# Altium footprint library HARTING THD.PcbLib: 113 footprints (part 3 of 11) (continued)
## HARTING_09 03 296 6850 [mm] "DIN 41612, Type C,  Thru-Hole Press-in Terminations; Rows a+b+c, 96 Position, Performance level 2, Lead 4.5mm, Pitch 2.54mm, Straight Female Connector" (continued)
  text "15" at -5.475,-36.135 h1.2
  text "1" at -4.075,-0.675 h1.2
Mechanical 8:
  lines w0.1: 1.54,-39.37 2.54,-39.37 ; 2.24,-84.37 4.78,-84.37 ; 2.24,5.63 4.78,5.63 ; 2.54,-40.37 2.54,-39.37 ; 2.54,-38.37 2.54,-39.37 ; 3.54,-39.37 2.54,-39.37
Mechanical 14:
  circle w0.1: c2.24,5.63 r1.425
  circle w0.1: c2.24,-84.37 r1.425
  lines w0.1: -2.71,-84.37 -0.735,-84.37 ; -2.71,5.63 -0.735,5.63 ; -0.735,-86.77 -0.735,-84.37 ; -0.735,8.03 -0.735,5.63 ; 3.665,-80.145 3.665,-81.845 ; 3.665,1.405 3.665,3.105 3.015,2.455 ; 3.757,3.105 5.215,5.63 ; 5.215,-86.77 5.215,-84.37 ; 5.215,8.03 5.215,5.63 ; 7.79,-84.37 5.215,-84.37 ; 7.79,5.63 5.215,5.63 ; -1.685,-81.845 -1.685,3.105 ; -1.685,-81.845 0,-81.845 0,-81.195 ; -1.685,-81.845 -1.035,-81.195 ; -1.685,3.105 0,3.105 0,2.455 ; -1.685,3.105 -1.035,2.455 ; -1.035,-81.195 0,-81.195 ; -1.035,-81.195 -1.035,2.455 ; -1.035,2.455 0,2.455 ; -0.735,-84.37 0.723,-81.845 2.54,-81.845 ; -0.735,5.63 0.723,3.105 2.54,3.105 2.54,2.455 ; 0,-81.195 0,-80.145 2.54,-80.145 2.54,-81.195 ; 0,2.455 0,1.405 2.54,1.405 2.54,2.455 ; 2.54,-81.845 3.665,-81.845 ; 2.54,-81.845 2.54,-81.195 ; 2.54,-81.195 3.015,-81.195 ; 2.54,2.455 3.015,2.455 ; 3.015,-81.195 3.665,-81.845 ; 3.015,-81.195 3.015,-80.145 5.08,-80.145 ; 3.015,2.455 3.015,1.405 5.08,1.405 ; 3.665,-81.845 3.757,-81.845 5.215,-84.37 ; 5.08,-80.145 5.08,-80.795 6.765,-80.795 ; 5.08,-80.145 6.115,-80.145 ; 5.08,1.405 5.08,2.055 6.765,2.055 ; 5.08,1.405 6.115,1.405 ; 6.115,-80.145 6.765,-80.795 ; 6.115,-80.145 6.115,1.405 ; 6.115,1.405 6.765,2.055 ; 6.765,-80.795 6.765,2.055 ; -2.71,-85.77 ccw(c-1.71,-85.77) -1.71,-86.77 6.79,-86.77 ccw(c6.79,-85.77) 7.79,-85.77 7.79,7.03 ccw(c6.79,7.03) 6.79,8.03 -1.71,8.03 ccw(c-1.71,7.03) -2.71,7.03 -2.71,-85.77
  text "a" at -1.951,3.96 h1.2
  text "c" at 5.305,2.935 h1.2
  text "10" at -5.475,-23.46 h1.2
  text "32" at -5.675,-79.365 h1.2
  text "5" at -4.55,-10.835 h1.2
  text "30" at -5.675,-74.285 h1.2
  text "25" at -5.675,-61.585 h1.2
  text "20" at -5.675,-48.885 h1.2
  text "15" at -5.475,-36.135 h1.2
  text "1" at -4.075,-0.675 h1.2
Drill Drawing:
  lines w0.1: -2.54,-58.42 -2.54,-81.28 7.62,-81.28 7.62,2.54 -2.54,2.54 -2.54,-20.32
  text "PRESS-FIT TECHNOLOGY diam. 1mm +0.1 -0" at -1.905,-56.515 h1
3D body "HARTING_09 03 296 6850.stp": height 11.6, standoff -4.5, extent -2.71,-86.82 7.79,8.08

## HARTING_09 03 296 6861 [mm] "DIN 41612, Type C, 96 Position, Rows a+b+c, Performance level 2, Press-in Lead Lead 13mm, Pitch 2.54mm, Straight Female Connector"
height 11.6
pads (98):
  round 1.5 hole 1: a1(0,0) a2(0,-2.54) a3(0,-5.08) a4(0,-7.62) a5(0,-10.16) a6(0,-12.7) a7(0,-15.24) a8(0,-17.78) a9(0,-20.32) a10(0,-22.86) a11(0,-25.4) a12(0,-27.94) a13(0,-30.48) a14(0,-33.02) a15(0,-35.56) a16(0,-38.1) a17(0,-40.64) a18(0,-43.18) a19(0,-45.72) a20(0,-48.26) a21(0,-50.8) a22(0,-53.34) a23(0,-55.88) a24(0,-58.42) a25(0,-60.96) a26(0,-63.5) a27(0,-66.04) a28(0,-68.58) a29(0,-71.12) a30(0,-73.66) a31(0,-76.2) a32(0,-78.74) b1(2.54,0) b2(2.54,-2.54) b3(2.54,-5.08) b4(2.54,-7.62) b5(2.54,-10.16) b6(2.54,-12.7) b7(2.54,-15.24) b8(2.54,-17.78) b9(2.54,-20.32) b10(2.54,-22.86) b11(2.54,-25.4) b12(2.54,-27.94) b13(2.54,-30.48) b14(2.54,-33.02) b15(2.54,-35.56) b16(2.54,-38.1) b17(2.54,-40.64) b18(2.54,-43.18) b19(2.54,-45.72) b20(2.54,-48.26) b21(2.54,-50.8) b22(2.54,-53.34) b23(2.54,-55.88) b24(2.54,-58.42) b25(2.54,-60.96) b26(2.54,-63.5) b27(2.54,-66.04) b28(2.54,-68.58) b29(2.54,-71.12) b30(2.54,-73.66) b31(2.54,-76.2) b32(2.54,-78.74) c1(5.08,0) c2(5.08,-2.54) c3(5.08,-5.08) c4(5.08,-7.62) c5(5.08,-10.16) c6(5.08,-12.7) c7(5.08,-15.24) c8(5.08,-17.78) c9(5.08,-20.32) c10(5.08,-22.86) c11(5.08,-25.4) c12(5.08,-27.94) c13(5.08,-30.48) c14(5.08,-33.02) c15(5.08,-35.56) c16(5.08,-38.1) c17(5.08,-40.64) c18(5.08,-43.18) c19(5.08,-45.72) c20(5.08,-48.26) c21(5.08,-50.8) c22(5.08,-53.34) c23(5.08,-55.88) c24(5.08,-58.42) c25(5.08,-60.96) c26(5.08,-63.5) c27(5.08,-66.04) c28(5.08,-68.58) c29(5.08,-71.12) c30(5.08,-73.66) c31(5.08,-76.2) c32(5.08,-78.74)
  round 3.5 / inner round 3.5 / far side round 5.1 hole 2.8: MTG1(2.24,5.63) MTG2(2.24,-84.37)
Top Overlay:
  lines w0.2: -1.06,-79.034 -1.06,-81.22 ; -1.06,0.294 -1.06,2.48 ; -0.76,-86.87 -0.76,-84.37 0.683,-81.87 3.797,-81.87 5.24,-84.37 5.24,-86.87 ; -0.76,8.13 -0.76,5.63 0.683,3.13 3.797,3.13 5.24,5.63 5.24,8.13 ; -0.51,-81.22 -1.06,-81.22 ; -0.51,2.48 -1.06,2.48 ; 2.49,-81.87 2.49,-80.87 -0.51,-80.87 -0.51,-81.87 -1.71,-81.87 ; 2.49,-81.22 3.04,-81.22 ; 2.49,2.48 3.04,2.48 ; 6.14,-79.034 6.14,-80.22 ; 6.14,0.294 6.14,1.48 ; -1.71,-81.87 -1.06,-81.22 ; -1.71,-81.87 -1.71,3.13 ; -1.71,3.13 -1.06,2.48 ; -1.71,3.13 -0.51,3.13 -0.51,2.13 2.49,2.13 2.49,3.13 3.69,3.13 ; 3.04,-81.22 3.69,-81.87 3.69,-80.87 ; 3.04,-81.22 3.04,-80.22 ; 3.04,-80.22 3.69,-80.87 ; 3.04,-80.22 6.14,-80.22 ; 3.04,1.48 6.14,1.48 ; 3.04,1.48 3.69,2.13 ; 3.04,1.48 3.04,2.48 ; 3.04,2.48 3.69,3.13 ; 3.69,-80.87 6.79,-80.87 ; 3.69,2.13 6.79,2.13 ; 3.69,2.13 3.69,3.13 ; 6.14,-80.22 6.79,-80.87 ; 6.14,1.48 6.79,2.13 ; 6.79,-80.87 6.79,2.13 ; -2.76,-85.87 ccw(c-1.76,-85.87) -1.76,-86.87 6.84,-86.87 ccw(c6.84,-85.87) 7.84,-85.87 7.84,7.13 ccw(c6.84,7.13) 6.84,8.13 -1.76,8.13 ccw(c-1.76,7.13) -2.76,7.13 -2.76,-85.87
  text "a" at -1.951,3.96 h1.2
  text "c" at 5.305,2.935 h1.2
  text "10" at -5.475,-23.46 h1.2
  text "32" at -5.675,-79.365 h1.2
  text "5" at -4.55,-10.835 h1.2
  text "30" at -5.675,-74.285 h1.2
  text "25" at -5.675,-61.585 h1.2
  text "20" at -5.675,-48.885 h1.2
  text "15" at -5.475,-36.135 h1.2
  text "1" at -4.075,-0.675 h1.2
Mechanical 8:
  lines w0.1: -1,-78.74 0,-78.74 ; -1,0 0,0 ; 0,-79.74 0,-78.74 ; 0,-77.74 0,-78.74 ; 0,-1 0,0 ; 0,1 0,0 ; 1,-78.74 0,-78.74 ; 1,0 0,0 ; 1.24,-84.37 2.24,-84.37 ; 1.24,5.63 2.24,5.63 ; 1.54,-78.74 2.54,-78.74 ; 1.54,-39.37 2.54,-39.37 ; 1.54,0 2.54,0 ; 2.24,-85.37 2.24,-84.37 ; 2.24,-83.37 2.24,-84.37 ; 2.24,4.63 2.24,5.63 ; 2.24,6.63 2.24,5.63 ; 2.54,-79.74 2.54,-78.74 ; 2.54,-77.74 2.54,-78.74 ; 2.54,-40.37 2.54,-39.37 ; 2.54,-38.37 2.54,-39.37 ; 2.54,-1 2.54,0 ; 2.54,1 2.54,0 ; 3.24,-84.37 2.24,-84.37 ; 3.24,5.63 2.24,5.63 ; 3.54,-78.74 2.54,-78.74 ; 3.54,-39.37 2.54,-39.37 ; 3.54,0 2.54,0 ; 4.08,-78.74 5.08,-78.74 ; 4.08,0 5.08,0 ; 4.78,-84.37 2.24,-84.37 ; 4.78,5.63 2.24,5.63 ; 5.08,-79.74 5.08,-78.74 ; 5.08,-77.74 5.08,-78.74 ; 5.08,-1 5.08,0 ; 5.08,1 5.08,0 ; 6.08,-78.74 5.08,-78.74 ; 6.08,0 5.08,0
Mechanical 14:
  circle w0.1: c2.24,5.63 r1.4
  circle w0.1: c2.24,-84.37 r1.4
  lines w0.1: -0.76,-86.87 -0.76,-84.37 0.683,-81.87 3.797,-81.87 5.24,-84.37 5.24,-86.87 ; -0.76,8.13 -0.76,5.63 0.683,3.13 3.797,3.13 5.24,5.63 5.24,8.13 ; -0.51,-81.22 -1.06,-81.22 ; -0.51,2.48 -1.06,2.48 ; 2.49,-81.87 2.49,-80.87 -0.51,-80.87 -0.51,-81.87 -1.71,-81.87 ; 2.49,-81.22 3.04,-81.22 ; 2.49,2.48 3.04,2.48 ; -1.71,-81.87 -1.06,-81.22 ; -1.71,-81.87 -1.71,3.13 ; -1.71,3.13 -1.06,2.48 ; -1.71,3.13 -0.51,3.13 -0.51,2.13 2.49,2.13 2.49,3.13 3.69,3.13 ; -1.06,-81.22 -1.06,2.48 ; 3.04,-81.22 3.04,-80.22 ; 3.04,-81.22 3.69,-81.87 3.69,-80.87 ; 3.04,-80.22 3.69,-80.87 ; 3.04,-80.22 6.14,-80.22 ; 3.04,1.48 3.69,2.13 ; 3.04,1.48 3.04,2.48 ; 3.04,1.48 6.14,1.48 ; 3.04,2.48 3.69,3.13 ; 3.69,-80.87 6.79,-80.87 ; 3.69,2.13 6.79,2.13 ; 3.69,2.13 3.69,3.13 ; 6.14,-80.22 6.79,-80.87 ; 6.14,-80.22 6.14,1.48 ; 6.14,1.48 6.79,2.13 ; 6.79,-80.87 6.79,2.13 ; -2.76,-85.87 ccw(c-1.76,-85.87) -1.76,-86.87 6.84,-86.87 ccw(c6.84,-85.87) 7.84,-85.87 7.84,7.13 ccw(c6.84,7.13) 6.84,8.13 -1.76,8.13 ccw(c-1.76,7.13) -2.76,7.13 -2.76,-85.87
  text "a" at -1.951,3.96 h1.2
  text "c" at 5.305,2.935 h1.2
  text "10" at -5.475,-23.46 h1.2
  text "32" at -5.675,-79.365 h1.2
  text "5" at -4.55,-10.835 h1.2
  text "30" at -5.675,-74.285 h1.2
  text "25" at -5.675,-61.585 h1.2
  text "20" at -5.675,-48.885 h1.2
  text "15" at -5.475,-36.135 h1.2
  text "1" at -4.075,-0.675 h1.2
Drill Drawing:
  lines w0.1: -2.54,-58.42 -2.54,-81.28 7.62,-81.28 7.62,2.54 -2.54,2.54 -2.54,-20.32
  text "PRESS-FIT TECHNOLOGY diam. 1mm +0.1 -0" at -2.005,-55.49 h1
3D body "HARTING_09 03 296 6861.stp": height 11.6, standoff -13, extent -2.76,-86.87 7.84,8.13

## HARTING_09 03 696 6921 [mm] "DIN 41612, Type C, Thru-Hole;  Rows a+b+c, 96 Position, Performance level 2, Lead 3.0 mm, Pitch 2.54mm, Right Angle Male Connector With Coding"
height 13.1
pads (98):
  round 1.7 hole 1: a1(0,0) a2(0,-2.54) a3(0,-5.08) a4(0,-7.62) a5(0,-10.16) a6(0,-12.7) a7(0,-15.24) a8(0,-17.78) a9(0,-20.32) a10(0,-22.86) a11(0,-25.4) a12(0,-27.94) a13(0,-30.48) a14(0,-33.02) a15(0,-35.56) a16(0,-38.1) a17(0,-40.64) a18(0,-43.18) a19(0,-45.72) a20(0,-48.26) a21(0,-50.8) a22(0,-53.34) a23(0,-55.88) a24(0,-58.42) a25(0,-60.96) a26(0,-63.5) a27(0,-66.04) a28(0,-68.58) a29(0,-71.12) a30(0,-73.66) a31(0,-76.2) a32(0,-78.74) b1(-2.54,0) b2(-2.54,-2.54) b3(-2.54,-5.08) b4(-2.54,-7.62) b5(-2.54,-10.16) b6(-2.54,-12.7) b7(-2.54,-15.24) b8(-2.54,-17.78) b9(-2.54,-20.32) b10(-2.54,-22.86) b11(-2.54,-25.4) b12(-2.54,-27.94) b13(-2.54,-30.48) b14(-2.54,-33.02) b15(-2.54,-35.56) b16(-2.54,-38.1) b17(-2.54,-40.64) b18(-2.54,-43.18) b19(-2.54,-45.72) b20(-2.54,-48.26) b21(-2.54,-50.8) b22(-2.54,-53.34) b23(-2.54,-55.88) b24(-2.54,-58.42) b25(-2.54,-60.96) b26(-2.54,-63.5) b27(-2.54,-66.04) b28(-2.54,-68.58) b29(-2.54,-71.12) b30(-2.54,-73.66) b31(-2.54,-76.2) b32(-2.54,-78.74) c1(-5.08,0) c2(-5.08,-2.54) c3(-5.08,-5.08) c4(-5.08,-7.62) c5(-5.08,-10.16) c6(-5.08,-12.7) c7(-5.08,-15.24) c8(-5.08,-17.78) c9(-5.08,-20.32) c10(-5.08,-22.86) c11(-5.08,-25.4) c12(-5.08,-27.94) c13(-5.08,-30.48) c14(-5.08,-33.02) c15(-5.08,-35.56) c16(-5.08,-38.1) c17(-5.08,-40.64) c18(-5.08,-43.18) c19(-5.08,-45.72) c20(-5.08,-48.26) c21(-5.08,-50.8) c22(-5.08,-53.34) c23(-5.08,-55.88) c24(-5.08,-58.42) c25(-5.08,-60.96) c26(-5.08,-63.5) c27(-5.08,-66.04) c28(-5.08,-68.58) c29(-5.08,-71.12) c30(-5.08,-73.66) c31(-5.08,-76.2) c32(-5.08,-78.74)
  round 3.5 / inner round 3.5 / far side round 5.1 hole 2.8: MTG1(2.54,5.08) MTG2(2.54,-83.82)
Top Overlay:
  lines w0.2: 1.5,-86.37 -0.36,-86.37 -0.36,-80.82 2.04,-80.82 ; 1.5,7.63 -0.36,7.63 -0.36,2.08 2.04,2.08 ; 3.8,-86.37 7.69,-86.37 7.69,-83.12 ; 3.8,7.63 7.69,7.63 7.69,4.38 ; 2.04,-80.97 4.052,-80.97 5.293,-83.12 12.64,-83.12 12.64,4.38 5.308,4.38 4.067,2.23 2.04,2.23 2.04,-80.97 ; 2.91,-78.395 9.94,-78.395 9.94,-0.345 2.91,-0.345 2.91,-78.395 ; 4.11,-73.395 5.96,-73.395 5.96,-71.345 4.11,-71.345 4.11,-73.395 ; 4.11,-67.395 5.96,-67.395 5.96,-65.345 4.11,-65.345 4.11,-67.395 ; 4.11,-61.395 5.96,-61.395 5.96,-59.345 4.11,-59.345 4.11,-61.395 ; 4.11,-55.395 5.96,-55.395 5.96,-53.345 4.11,-53.345 4.11,-55.395 ; 4.11,-49.395 5.96,-49.395 5.96,-47.345 4.11,-47.345 4.11,-49.395 ; 4.11,-43.395 5.96,-43.395 5.96,-41.345 4.11,-41.345 4.11,-43.395 ; 4.11,-37.395 5.96,-37.395 5.96,-35.345 4.11,-35.345 4.11,-37.395 ; 4.11,-31.395 5.96,-31.395 5.96,-29.345 4.11,-29.345 4.11,-31.395 ; 4.11,-25.395 5.96,-25.395 5.96,-23.345 4.11,-23.345 4.11,-25.395 ; 4.11,-19.395 5.96,-19.395 5.96,-17.345 4.11,-17.345 4.11,-19.395 ; 4.11,-13.395 5.96,-13.395 5.96,-11.345 4.11,-11.345 4.11,-13.395 ; 4.11,-7.395 5.96,-7.395 5.96,-5.345 4.11,-5.345 4.11,-7.395
  text "a" at -1.175,2.05 h1.2
  text "b" at -2.75,2.08 h1.2
  text "c" at -4.9,2.025 h1.2
  text "1" at -7.045,-0.55 h1.2
  text "32" at -8.57,-79.39 h1.2
  text "5" at -7.445,-10.86 h1.2
  text "10" at -8.495,-23.51 h1.2
  text "15" at -8.47,-36.11 h1.2
  text "20" at -8.57,-48.91 h1.2
  text "25" at -8.57,-61.61 h1.2
  text "30" at -8.57,-74.31 h1.2
Mechanical 8:
  drawing of 394 lines, arcs and shapes, not listed
  text "PCB" at 5.08,-41.275 h1.2
Mechanical 14:
  drawing of 166 lines, arcs and shapes, not listed
  text "1" at -7.045,-0.55 h1.2
  text "32" at -8.57,-79.39 h1.2
  text "5" at -7.445,-10.86 h1.2
  text "10" at -8.495,-23.51 h1.2
  text "15" at -8.47,-36.11 h1.2
  text "20" at -8.57,-48.91 h1.2
  text "25" at -8.57,-61.61 h1.2
  text "30" at -8.57,-74.31 h1.2
  text "c" at -4.9,2.025 h1.2
  text "b" at -2.75,2.08 h1.2
  text "a" at -1.175,2.05 h1.2
  text "c" at -4.445,-0.635 h1.2
  text "a" at 0.635,-0.635 h1.2
3D body "HARTING_09 03 696 6921.stp": height 11.45, standoff -3, extent -5.38,-86.37 12.64,7.63

## HARTING_09 03 796 6825 [mm] "DIN 41612, Type C, Thru-Hole; Rows a+b+c, 96 Position, Performance level 2, Lead 4.5mm, Pitch 2.54mm, Straight Female Backplane Connector With Coding"
height 11.6
pads (98):
  round 1.7 hole 1: a1(0,0) a2(0,-2.54) a3(0,-5.08) a4(0,-7.62) a5(0,-10.16) a6(0,-12.7) a7(0,-15.24) a8(0,-17.78) a9(0,-20.32) a10(0,-22.86) a11(0,-25.4) a12(0,-27.94) a13(0,-30.48) a14(0,-33.02) a15(0,-35.56) a16(0,-38.1) a17(0,-40.64) a18(0,-43.18) a19(0,-45.72) a20(0,-48.26) a21(0,-50.8) a22(0,-53.34) a23(0,-55.88) a24(0,-58.42) a25(0,-60.96) a26(0,-63.5) a27(0,-66.04) a28(0,-68.58) a29(0,-71.12) a30(0,-73.66) a31(0,-76.2) a32(0,-78.74) b1(2.54,0) b2(2.54,-2.54) b3(2.54,-5.08) b4(2.54,-7.62) b5(2.54,-10.16) b6(2.54,-12.7) b7(2.54,-15.24) b8(2.54,-17.78) b9(2.54,-20.32) b10(2.54,-22.86) b11(2.54,-25.4) b12(2.54,-27.94) b13(2.54,-30.48) b14(2.54,-33.02) b15(2.54,-35.56) b16(2.54,-38.1) b17(2.54,-40.64) b18(2.54,-43.18) b19(2.54,-45.72) b20(2.54,-48.26) b21(2.54,-50.8) b22(2.54,-53.34) b23(2.54,-55.88) b24(2.54,-58.42) b25(2.54,-60.96) b26(2.54,-63.5) b27(2.54,-66.04) b28(2.54,-68.58) b29(2.54,-71.12) b30(2.54,-73.66) b31(2.54,-76.2) b32(2.54,-78.74) c1(5.08,0) c2(5.08,-2.54) c3(5.08,-5.08) c4(5.08,-7.62) c5(5.08,-10.16) c6(5.08,-12.7) c7(5.08,-15.24) c8(5.08,-17.78) c9(5.08,-20.32) c10(5.08,-22.86) c11(5.08,-25.4) c12(5.08,-27.94) c13(5.08,-30.48) c14(5.08,-33.02) c15(5.08,-35.56) c16(5.08,-38.1) c17(5.08,-40.64) c18(5.08,-43.18) c19(5.08,-45.72) c20(5.08,-48.26) c21(5.08,-50.8) c22(5.08,-53.34) c23(5.08,-55.88) c24(5.08,-58.42) c25(5.08,-60.96) c26(5.08,-63.5) c27(5.08,-66.04) c28(5.08,-68.58) c29(5.08,-71.12) c30(5.08,-73.66) c31(5.08,-76.2) c32(5.08,-78.74)
  round 3.5 / inner round 3.5 / far side round 5.1 hole 2.8: MTG1(2.24,5.63) MTG2(2.24,-84.37)
Top Overlay:
  drawing of 160 lines, arcs and shapes, not listed
  text "1" at -4.075,-0.675 h1.2
  text "15" at -5.475,-36.135 h1.2
  text "20" at -5.675,-48.885 h1.2
  text "25" at -5.675,-61.585 h1.2
  text "30" at -5.675,-74.285 h1.2
  text "5" at -4.55,-10.835 h1.2
  text "32" at -5.675,-79.365 h1.2
  text "10" at -5.475,-23.46 h1.2
  text "c" at 5.305,2.935 h1.2
  text "a" at -1.951,3.96 h1.2
Mechanical 8:
  drawing of 396 lines, arcs and shapes, not listed
Mechanical 14:
  drawing of 1310 lines, arcs and shapes, not listed
  text "1" at -4.075,-0.675 h1.2
  text "15" at -5.475,-36.135 h1.2
  text "20" at -5.675,-48.885 h1.2
  text "25" at -5.675,-61.585 h1.2
  text "30" at -5.675,-74.285 h1.2
  text "5" at -4.55,-10.835 h1.2
  text "32" at -5.675,-79.365 h1.2
  text "10" at -5.475,-23.46 h1.2
  text "c" at 5.305,2.935 h1.2
  text "a" at -1.951,3.96 h1.2
3D body "HARTING_09 03 796 6825.stp": height 11.6, standoff -4.5, extent -2.71,-86.82 9.99,8.08

## HARTING_09 03 796 6850 [mm] "DIN 41612, Type C, Thru-Hole Press-in Terminations; Rows a+b+c, 96 Position, Performance level 2, Lead 4.5mm, Pitch 2.54mm, Straight Female Backplane Connector With Coding"
height 11.6
pads (98):
  round 1.7 hole 1: a1(0,0) a2(0,-2.54) a3(0,-5.08) a4(0,-7.62) a5(0,-10.16) a6(0,-12.7) a7(0,-15.24) a8(0,-17.78) a9(0,-20.32) a10(0,-22.86) a11(0,-25.4) a12(0,-27.94) a13(0,-30.48) a14(0,-33.02) a15(0,-35.56) a16(0,-38.1) a17(0,-40.64) a18(0,-43.18) a19(0,-45.72) a20(0,-48.26) a21(0,-50.8) a22(0,-53.34) a23(0,-55.88) a24(0,-58.42) a25(0,-60.96) a26(0,-63.5) a27(0,-66.04) a28(0,-68.58) a29(0,-71.12) a30(0,-73.66) a31(0,-76.2) a32(0,-78.74) b1(2.54,0) b2(2.54,-2.54) b3(2.54,-5.08) b4(2.54,-7.62) b5(2.54,-10.16) b6(2.54,-12.7) b7(2.54,-15.24) b8(2.54,-17.78) b9(2.54,-20.32) b10(2.54,-22.86) b11(2.54,-25.4) b12(2.54,-27.94) b13(2.54,-30.48) b14(2.54,-33.02) b15(2.54,-35.56) b16(2.54,-38.1) b17(2.54,-40.64) b18(2.54,-43.18) b19(2.54,-45.72) b20(2.54,-48.26) b21(2.54,-50.8) b22(2.54,-53.34) b23(2.54,-55.88) b24(2.54,-58.42) b25(2.54,-60.96) b26(2.54,-63.5) b27(2.54,-66.04) b28(2.54,-68.58) b29(2.54,-71.12) b30(2.54,-73.66) b31(2.54,-76.2) b32(2.54,-78.74) c1(5.08,0) c2(5.08,-2.54) c3(5.08,-5.08) c4(5.08,-7.62) c5(5.08,-10.16) c6(5.08,-12.7) c7(5.08,-15.24) c8(5.08,-17.78) c9(5.08,-20.32) c10(5.08,-22.86) c11(5.08,-25.4) c12(5.08,-27.94) c13(5.08,-30.48) c14(5.08,-33.02) c15(5.08,-35.56) c16(5.08,-38.1) c17(5.08,-40.64) c18(5.08,-43.18) c19(5.08,-45.72) c20(5.08,-48.26) c21(5.08,-50.8) c22(5.08,-53.34) c23(5.08,-55.88) c24(5.08,-58.42) c25(5.08,-60.96) c26(5.08,-63.5) c27(5.08,-66.04) c28(5.08,-68.58) c29(5.08,-71.12) c30(5.08,-73.66) c31(5.08,-76.2) c32(5.08,-78.74)
  round 3.5 / inner round 3.5 / far side round 5.1 hole 2.8: MTG1(2.24,5.63) MTG2(2.24,-84.37)
Top Overlay:
  drawing of 160 lines, arcs and shapes, not listed
  text "a" at -1.951,3.96 h1.2
  text "c" at 5.305,2.935 h1.2
  text "10" at -5.475,-23.46 h1.2
  text "32" at -5.675,-79.365 h1.2
  text "5" at -4.55,-10.835 h1.2
  text "30" at -5.675,-74.285 h1.2
  text "25" at -5.675,-61.585 h1.2
  text "20" at -5.675,-48.885 h1.2
  text "15" at -5.475,-36.135 h1.2
  text "1" at -4.075,-0.675 h1.2
Mechanical 8:
  drawing of 396 lines, arcs and shapes, not listed
Mechanical 14:
  drawing of 1310 lines, arcs and shapes, not listed
  text "a" at -1.951,3.96 h1.2
  text "c" at 5.305,2.935 h1.2
  text "10" at -5.475,-23.46 h1.2
  text "32" at -5.675,-79.365 h1.2
  text "5" at -4.55,-10.835 h1.2
  text "30" at -5.675,-74.285 h1.2
  text "25" at -5.675,-61.585 h1.2
  text "20" at -5.675,-48.885 h1.2
  text "15" at -5.475,-36.135 h1.2
  text "1" at -4.075,-0.675 h1.2
Drill Drawing:
  lines w0.1: -2.54,-58.42 -2.54,-81.28 7.62,-81.28 7.62,2.54 -2.54,2.54 -2.54,-20.32
  text "PRESS-FIT TECHNOLOGY diam. 1mm +0.1 -0" at -1.905,-56.515 h1
3D body "HARTING_09 03 796 6850.stp": height 11.6, standoff -4.5, extent -2.71,-86.82 9.99,8.08

## HARTING_09 04 132 2921 [mm] "Eurocard DIN 41612, Type D, 32 Position, Rows a+c, Performance level 1, Male, Lead 3.0 mm, Pitch 5.08 mm"
height 11
pads (34):
  round 1.7 hole 1: a2(0,0) a4(0,-5.08) a6(0,-10.16) a8(0,-15.24) a10(0,-20.32) a12(0,-25.4) a14(0,-30.48) a16(0,-35.56) a18(0,-40.64) a20(0,-45.72) a22(0,-50.8) a24(0,-55.88) a26(0,-60.96) a28(0,-66.04) a30(0,-71.12) a32(0,-76.2) c2(-5.08,0) c4(-5.08,-5.08) c6(-5.08,-10.16) c8(-5.08,-15.24) c10(-5.08,-20.32) c12(-5.08,-25.4) c14(-5.08,-30.48) c16(-5.08,-35.56) c18(-5.08,-40.64) c20(-5.08,-45.72) c22(-5.08,-50.8) c24(-5.08,-55.88) c26(-5.08,-60.96) c28(-5.08,-66.04) c30(-5.08,-71.12) c32(-5.08,-76.2)
  round 3.5 / inner round 3.5 / far side round 5.1 hole 2.8: MTG1(2.54,7.62) MTG2(2.54,-81.28)
Top Overlay:
  lines w0.2: 1.65,-83.78 -0.31,-83.78 -0.31,-78.28 2.04,-78.28 ; 1.65,10.12 -0.31,10.12 -0.31,4.62 2.04,4.62 ; 2.04,-75.05 4.84,-75.05 ccw(c4.84,-74.85) 5.04,-74.85 5.04,-72.83 ccw(c4.84,-72.83) 4.84,-72.63 2.04,-72.63 ; 2.04,-71.43 4.84,-71.43 ccw(c4.84,-71.23) 5.04,-71.23 5.04,-67.63 ccw(c4.84,-67.63) 4.84,-67.43 2.04,-67.43 ; 2.04,-66.23 4.84,-66.23 ccw(c4.84,-66.03) 5.04,-66.03 5.04,-61.63 ccw(c4.84,-61.63) 4.84,-61.43 2.04,-61.43 ; 2.04,-60.23 4.84,-60.23 ccw(c4.84,-60.03) 5.04,-60.03 5.04,-55.63 ccw(c4.84,-55.63) 4.84,-55.43 2.04,-55.43 ; 2.04,-54.23 4.84,-54.23 ccw(c4.84,-54.03) 5.04,-54.03 5.04,-49.63 ccw(c4.84,-49.63) 4.84,-49.43 2.04,-49.43 ; 2.04,-48.23 4.84,-48.23 ccw(c4.84,-48.03) 5.04,-48.03 5.04,-43.63 ccw(c4.84,-43.63) 4.84,-43.43 2.04,-43.43 ; 2.04,-42.23 4.84,-42.23 ccw(c4.84,-42.03) 5.04,-42.03 5.04,-37.63 ccw(c4.84,-37.63) 4.84,-37.43 2.04,-37.43 ; 2.04,-36.23 4.84,-36.23 ccw(c4.84,-36.03) 5.04,-36.03 5.04,-31.63 ccw(c4.84,-31.63) 4.84,-31.43 2.04,-31.43 ; 2.04,-30.23 4.84,-30.23 ccw(c4.84,-30.03) 5.04,-30.03 5.04,-25.63 ccw(c4.84,-25.63) 4.84,-25.43 2.04,-25.43 ; 2.04,-24.23 4.84,-24.23 ccw(c4.84,-24.03) 5.04,-24.03 5.04,-19.63 ccw(c4.84,-19.63) 4.84,-19.43 2.04,-19.43 ; 2.04,-18.23 4.84,-18.23 ccw(c4.84,-18.03) 5.04,-18.03 5.04,-13.63 ccw(c4.84,-13.63) 4.84,-13.43 2.04,-13.43 ; 2.04,-12.23 4.84,-12.23 ccw(c4.84,-12.03) 5.04,-12.03 5.04,-7.63 ccw(c4.84,-7.63) 4.84,-7.43 2.04,-7.43 ; 2.04,-6.23 4.84,-6.23 ccw(c4.84,-6.03) 5.04,-6.03 5.04,-2.43 ccw(c4.84,-2.43) 4.84,-2.23 2.04,-2.23 ; 2.04,-1.03 4.84,-1.03 ccw(c4.84,-0.83) 5.04,-0.83 5.04,1.19 ccw(c4.84,1.19) 4.84,1.39 2.04,1.39 ; 2.04,3.69 4.84,3.69 ccw(c4.84,3.89) 5.04,3.89 5.04,6.75 ; 3.275,-83.78 7.74,-83.78 7.74,-80.53 ; 3.275,10.12 7.74,10.12 7.74,6.87 ; 2.04,-77.35 4.84,-77.35 cw(c4.84,-77.55) 5.04,-77.55 5.04,-80.41 ; 2.04,-77.35 2.04,-77.55 2.04,-78.43 3.897,-78.43 5.04,-80.41 ; 2.04,-77.35 2.04,4.77 3.897,4.77 5.04,6.75 ; 5.04,-80.41 5.109,-80.53 12.64,-80.53 12.64,6.87 5.109,6.87 5.04,6.75
  text "30" at -8.57,-71.795 h1.2
  text "28" at -8.57,-66.715 h1.2
  text "20" at -8.57,-46.395 h1.2
  text "10" at -8.57,-20.995 h1.2
  text "32" at -8.57,-76.875 h1.2
  text "a" at 0.635,1.905 h1.2
  text "c" at -4.445,1.905 h1.2
  text "26" at -8.57,-61.635 h1.2
  text "24" at -8.57,-56.555 h1.2
  text "22" at -8.57,-51.475 h1.2
  text "18" at -8.57,-41.315 h1.2
  text "16" at -8.57,-36.235 h1.2
  text "14" at -8.57,-31.155 h1.2
  text "12" at -8.57,-26.075 h1.2
  text "8" at -8.57,-15.915 h1.2
  text "6" at -8.57,-10.835 h1.2
  text "4" at -8.57,-5.755 h1.2
  text "2" at -8.57,-0.675 h1.2
Mechanical 8:
  lines w0.1: 5.3,-76.2 5.3,-40.475 ; 5.3,-35.725 5.3,0
  text "PCB" at 6.05,-40.1 h1.2
Mechanical 14:
  lines w0.1: 2.04,-78.28 -0.31,-78.28 -0.31,-83.78 7.74,-83.78 7.74,-80.53 ; 2.04,-75.05 4.84,-75.05 ccw(c4.84,-74.85) 5.04,-74.85 5.04,-72.83 ccw(c4.84,-72.83) 4.84,-72.63 2.04,-72.63 ; 2.04,-71.43 4.84,-71.43 ccw(c4.84,-71.23) 5.04,-71.23 5.04,-67.63 ccw(c4.84,-67.63) 4.84,-67.43 2.04,-67.43 ; 2.04,-66.23 4.84,-66.23 ccw(c4.84,-66.03) 5.04,-66.03 5.04,-61.63 ccw(c4.84,-61.63) 4.84,-61.43 2.04,-61.43 ; 2.04,-60.23 4.84,-60.23 ccw(c4.84,-60.03) 5.04,-60.03 5.04,-55.63 ccw(c4.84,-55.63) 4.84,-55.43 2.04,-55.43 ; 2.04,-54.23 4.84,-54.23 ccw(c4.84,-54.03) 5.04,-54.03 5.04,-49.63 ccw(c4.84,-49.63) 4.84,-49.43 2.04,-49.43 ; 2.04,-48.23 4.84,-48.23 ccw(c4.84,-48.03) 5.04,-48.03 5.04,-43.63 ccw(c4.84,-43.63) 4.84,-43.43 2.04,-43.43 ; 2.04,-42.23 4.84,-42.23 ccw(c4.84,-42.03) 5.04,-42.03 5.04,-37.63 ccw(c4.84,-37.63) 4.84,-37.43 2.04,-37.43 ; 2.04,-36.23 4.84,-36.23 ccw(c4.84,-36.03) 5.04,-36.03 5.04,-31.63 ccw(c4.84,-31.63) 4.84,-31.43 2.04,-31.43 ; 2.04,-30.23 4.84,-30.23 ccw(c4.84,-30.03) 5.04,-30.03 5.04,-25.63 ccw(c4.84,-25.63) 4.84,-25.43 2.04,-25.43 ; 2.04,-24.23 4.84,-24.23 ccw(c4.84,-24.03) 5.04,-24.03 5.04,-19.63 ccw(c4.84,-19.63) 4.84,-19.43 2.04,-19.43 ; 2.04,-18.23 4.84,-18.23 ccw(c4.84,-18.03) 5.04,-18.03 5.04,-13.63 ccw(c4.84,-13.63) 4.84,-13.43 2.04,-13.43 ; 2.04,-12.23 4.84,-12.23 ccw(c4.84,-12.03) 5.04,-12.03 5.04,-7.63 ccw(c4.84,-7.63) 4.84,-7.43 2.04,-7.43 ; 2.04,-6.23 4.84,-6.23 ccw(c4.84,-6.03) 5.04,-6.03 5.04,-2.43 ccw(c4.84,-2.43) 4.84,-2.23 2.04,-2.23 ; 2.04,-1.03 4.84,-1.03 ccw(c4.84,-0.83) 5.04,-0.83 5.04,1.19 ccw(c4.84,1.19) 4.84,1.39 2.04,1.39 ; 2.04,3.69 4.84,3.69 ccw(c4.84,3.89) 5.04,3.89 5.04,6.75 ; 2.04,4.62 -0.31,4.62 -0.31,10.12 7.74,10.12 7.74,6.87 ; 2.04,-77.35 2.04,4.77 3.897,4.77 5.04,6.75 ; 2.04,-77.35 2.04,-77.55 2.04,-78.43 3.897,-78.43 5.04,-80.41 ; 2.04,-77.35 4.84,-77.35 cw(c4.84,-77.55) 5.04,-77.55 5.04,-80.41 ; 5.04,-80.41 5.109,-80.53 12.64,-80.53 12.64,6.87 5.109,6.87 5.04,6.75
  text "2" at -8.57,-0.675 h1.2
  text "4" at -8.57,-5.755 h1.2
  text "6" at -8.57,-10.835 h1.2
  text "8" at -8.57,-15.915 h1.2
  text "12" at -8.57,-26.075 h1.2
  text "14" at -8.57,-31.155 h1.2
  text "16" at -8.57,-36.235 h1.2
  text "18" at -8.57,-41.315 h1.2
  text "22" at -8.57,-51.475 h1.2
  text "24" at -8.57,-56.555 h1.2
  text "26" at -8.57,-61.635 h1.2
  text "32" at -8.57,-76.875 h1.2
  text "10" at -8.57,-20.995 h1.2
  text "20" at -8.57,-46.395 h1.2
  text "28" at -8.57,-66.715 h1.2
  text "30" at -8.57,-71.795 h1.2
  text "c" at -4.445,1.905 h1.2
  text "a" at 0.635,1.905 h1.2
3D body "HARTING_09 04 132 2921.stp": height 9.4, standoff -3, extent -5.38,-83.83 12.64,10.17